# Altium integrated library Samtec 2 mm Pitch Terminal Strips.IntLib: 623 symbols (part 3 of 5)
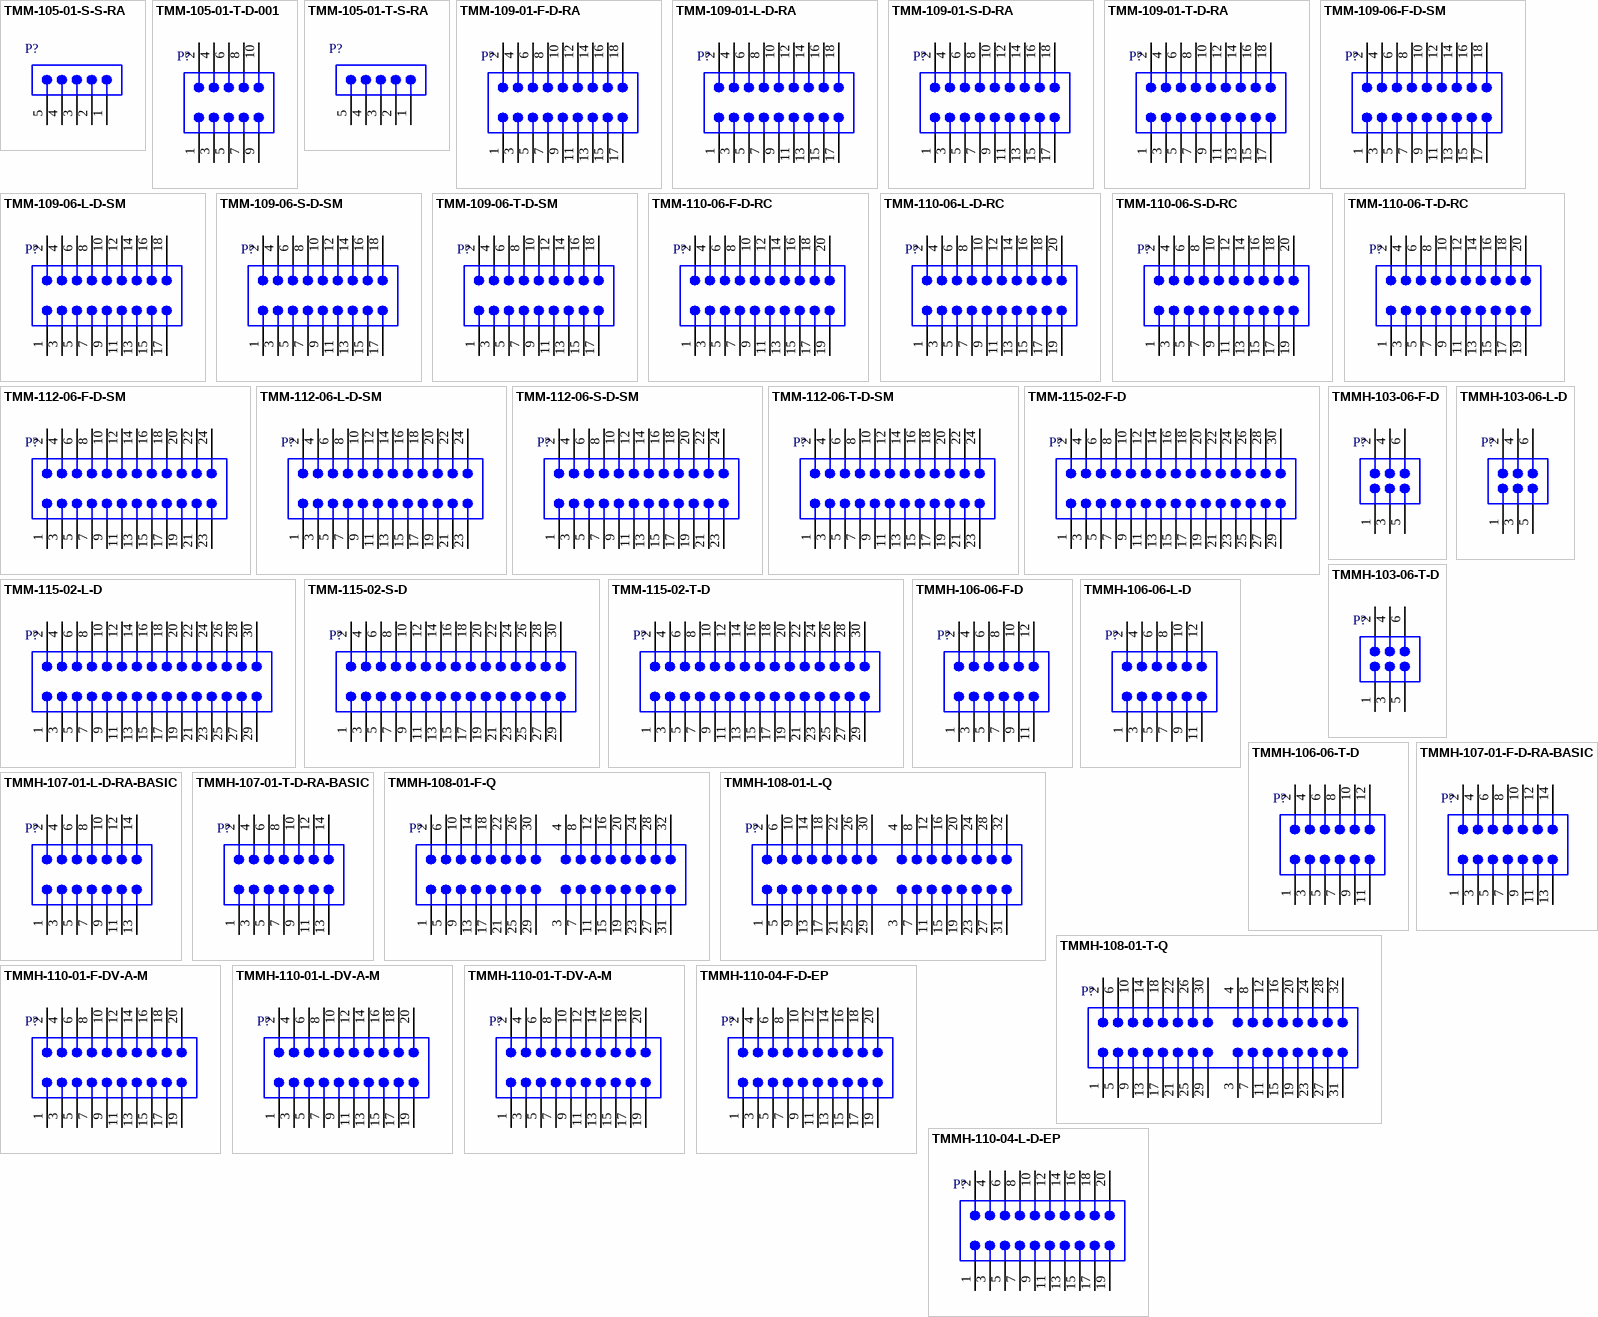
[diagram p19: symbols TMM-105-01-S-S-RA to TMMH-110-04-L-D-EP]

## TMMH-107-01-F-D-RA-BASIC
designator P?
Flexible Through-Hole Header, Right Angle, -55 to 125 degC, 2 mm Pitch, 14-Pin, Male, RoHS; Manufacturer: Samtec; PartNumber: TMMH-107-01-F-D-RA-BASIC; Pitch: 2 mm; DatasheetVersion: F-214; PackageVersion: AN, 12/1996; PackageReference: TMMH-107-01-X-D-RA-BASIC; PackageDescription: 2mm x 2mm RA Terminal Strip Assembly; Orientation: Right Angle; RoHS: True; Temperature Range: -55 to 125 degC; Mounting Technology: Through-hole; ComponentLink1Description: Manufacturer URL; ComponentLink1URL: http://www.samtec.com; ComponentLink2Description: Datasheet; ComponentLink2URL: http://d2a072wq521u33.cloudfront.net/catalog_english//TMMH_TH.PDF; ComponentLink3Description: Package Specification; ComponentLink3URL: http://www.samtec.com/documents/webfiles/cpdf/TMMH-1XX-XX-XX-X-XX-XX-XXX-MKT1.pdf
footprint SMTC-TMMH-107-01-X-D-RA-BASIC (Terminal Strip Assembly, 2x7 Pins, Right Angle, 2mm Pitch, Male)
pins: 1, 2, 3, 4, 5, 6, 7, 8, 9, 10, 11, 12, 13, 14

## TMMH-107-01-L-D-RA-BASIC
designator P?
Flexible Through-Hole Header, Right Angle, -55 to 125 degC, 2 mm Pitch, 14-Pin, Male, RoHS; Manufacturer: Samtec; PartNumber: TMMH-107-01-L-D-RA-BASIC; Pitch: 2 mm; DatasheetVersion: F-214; PackageVersion: AN, 12/1996; PackageReference: TMMH-107-01-X-D-RA-BASIC; PackageDescription: 2mm x 2mm RA Terminal Strip Assembly; Orientation: Right Angle; RoHS: True; Temperature Range: -55 to 125 degC; Mounting Technology: Through-hole; ComponentLink1Description: Manufacturer URL; ComponentLink1URL: http://www.samtec.com; ComponentLink2Description: Datasheet; ComponentLink2URL: http://d2a072wq521u33.cloudfront.net/catalog_english//TMMH_TH.PDF; ComponentLink3Description: Package Specification; ComponentLink3URL: http://www.samtec.com/documents/webfiles/cpdf/TMMH-1XX-XX-XX-X-XX-XX-XXX-MKT1.pdf
footprint SMTC-TMMH-107-01-X-D-RA-BASIC (Terminal Strip Assembly, 2x7 Pins, Right Angle, 2mm Pitch, Male)
pins: 1, 2, 3, 4, 5, 6, 7, 8, 9, 10, 11, 12, 13, 14

## TMMH-107-01-T-D-RA-BASIC
designator P?
Flexible Through-Hole Header, Right Angle, -55 to 105 degC, 2 mm Pitch, 14-Pin, Male, RoHS; Manufacturer: Samtec; PartNumber: TMMH-107-01-T-D-RA-BASIC; Pitch: 2 mm; DatasheetVersion: F-214; PackageVersion: AN, 12/1996; PackageReference: TMMH-107-01-X-D-RA-BASIC; PackageDescription: 2mm x 2mm RA Terminal Strip Assembly; Orientation: Right Angle; RoHS: True; Temperature Range: -55 to 105 degC; Mounting Technology: Through-hole; ComponentLink1Description: Manufacturer URL; ComponentLink1URL: http://www.samtec.com; ComponentLink2Description: Datasheet; ComponentLink2URL: http://d2a072wq521u33.cloudfront.net/catalog_english//TMMH_TH.PDF; ComponentLink3Description: Package Specification; ComponentLink3URL: http://www.samtec.com/documents/webfiles/cpdf/TMMH-1XX-XX-XX-X-XX-XX-XXX-MKT1.pdf
footprint SMTC-TMMH-107-01-X-D-RA-BASIC (Terminal Strip Assembly, 2x7 Pins, Right Angle, 2mm Pitch, Male)
pins: 1, 2, 3, 4, 5, 6, 7, 8, 9, 10, 11, 12, 13, 14

## TMMH-108-01-F-Q
designator P?
Flexible Through-Hole Header, Vertical, -55 to 125 degC, 2 mm Pitch, 32-Pin, Male, RoHS; Manufacturer: Samtec; PartNumber: TMMH-108-01-F-Q; Pitch: 2 mm; DatasheetVersion: F-214; PackageVersion: Q, 11/1997; PackageReference: TMMH-108-01-X-Q; PackageDescription: 2mm x 2mm Terminal Strip Assembly; Supplier 1: Newark; Supplier Part Number 1: 75P7798; Orientation: Vertical; RoHS: True; Temperature Range: -55 to 125 degC; Mounting Technology: Through-hole; ComponentLink1Description: Manufacturer URL; ComponentLink1URL: http://www.samtec.com; ComponentLink2Description: Datasheet; ComponentLink2URL: http://d2a072wq521u33.cloudfront.net/catalog_english//TMMH_TH.PDF; ComponentLink3Description: Package Specification; ComponentLink3URL: http://www.samtec.com/documents/webfiles/cpdf/TMMH-1XX-XX-XX-X-XXX-MKT.pdf
footprint SMTC-TMMH-108-01-X-Q (Terminal Strip Assembly, 4x8 Pins, Vertical, 2mm Pitch, Male)
pins: 1, 2, 3, 4, 5, 6, 7, 8, 9, 10, 11, 12, 13, 14, 15, 16, 17, 18, 19, 20, 21, 22, 23, 24, 25, 26, 27, 28, 29, 30, 31, 32

## TMMH-108-01-L-Q
designator P?
Flexible Through-Hole Header, Vertical, -55 to 125 degC, 2 mm Pitch, 32-Pin, Male, RoHS; Manufacturer: Samtec; PartNumber: TMMH-108-01-L-Q; Pitch: 2 mm; DatasheetVersion: F-214; PackageVersion: Q, 11/1997; PackageReference: TMMH-108-01-X-Q; PackageDescription: 2mm x 2mm Terminal Strip Assembly; Supplier 1: Newark; Supplier Part Number 1: 75P7838; Orientation: Vertical; RoHS: True; Temperature Range: -55 to 125 degC; Mounting Technology: Through-hole; ComponentLink1Description: Manufacturer URL; ComponentLink1URL: http://www.samtec.com; ComponentLink2Description: Datasheet; ComponentLink2URL: http://d2a072wq521u33.cloudfront.net/catalog_english//TMMH_TH.PDF; ComponentLink3Description: Package Specification; ComponentLink3URL: http://www.samtec.com/documents/webfiles/cpdf/TMMH-1XX-XX-XX-X-XXX-MKT.pdf
footprint SMTC-TMMH-108-01-X-Q (Terminal Strip Assembly, 4x8 Pins, Vertical, 2mm Pitch, Male)
pins: 1, 2, 3, 4, 5, 6, 7, 8, 9, 10, 11, 12, 13, 14, 15, 16, 17, 18, 19, 20, 21, 22, 23, 24, 25, 26, 27, 28, 29, 30, 31, 32

## TMMH-108-01-T-Q
designator P?
Flexible Through-Hole Header, Vertical, -55 to 105 degC, 2 mm Pitch, 32-Pin, Male, RoHS; Manufacturer: Samtec; PartNumber: TMMH-108-01-T-Q; Pitch: 2 mm; DatasheetVersion: F-214; PackageVersion: Q, 11/1997; PackageReference: TMMH-108-01-X-Q; PackageDescription: 2mm x 2mm Terminal Strip Assembly; Supplier 1: Newark; Supplier Part Number 1: 75P7880; Orientation: Vertical; RoHS: True; Temperature Range: -55 to 105 degC; Mounting Technology: Through-hole; ComponentLink1Description: Manufacturer URL; ComponentLink1URL: http://www.samtec.com; ComponentLink2Description: Datasheet; ComponentLink2URL: http://d2a072wq521u33.cloudfront.net/catalog_english//TMMH_TH.PDF; ComponentLink3Description: Package Specification; ComponentLink3URL: http://www.samtec.com/documents/webfiles/cpdf/TMMH-1XX-XX-XX-X-XXX-MKT.pdf
footprint SMTC-TMMH-108-01-X-Q (Terminal Strip Assembly, 4x8 Pins, Vertical, 2mm Pitch, Male)
pins: 1, 2, 3, 4, 5, 6, 7, 8, 9, 10, 11, 12, 13, 14, 15, 16, 17, 18, 19, 20, 21, 22, 23, 24, 25, 26, 27, 28, 29, 30, 31, 32

## TMMH-110-01-F-DV-A-M
designator P?
Flexible SMT Header, Vertical, -55 to 125 degC, 2 mm Pitch, 20-Pin, Male, RoHS; Manufacturer: Samtec; PartNumber: TMMH-110-01-F-DV-A-M; Pitch: 2 mm; DatasheetVersion: F-214; PackageVersion: CD, 10/1996; PackageReference: TMMH-110-01-X-DV-A-M; PackageDescription: 2mm x 2mm Terminal Strip Assembly; Orientation: Vertical; RoHS: True; Temperature Range: -55 to 125 degC; Mounting Technology: Surface Mount; ComponentLink1Description: Manufacturer URL; ComponentLink1URL: http://www.samtec.com; ComponentLink2Description: Datasheet; ComponentLink2URL: http://d2a072wq521u33.cloudfront.net/catalog_english//TMMH_SM.PDF; ComponentLink3Description: Package Specification; ComponentLink3URL: http://www.samtec.com/documents/webfiles/cpdf/TMMH-1XX-XX-XX-DV-XXX-XXX-MKT.PDF
footprint SMTC-TMMH-110-01-X-DV-A-M (Terminal Strip Assembly, 2x10 Pins, Vertical, 2mm Pitch, Male)
pins: 1, 2, 3, 4, 5, 6, 7, 8, 9, 10, 11, 12, 13, 14, 15, 16, 17, 18, 19, 20

## TMMH-110-01-L-DV-A-M
designator P?
Flexible SMT Header, Vertical, -55 to 125 degC, 2 mm Pitch, 20-Pin, Male, RoHS; Manufacturer: Samtec; PartNumber: TMMH-110-01-L-DV-A-M; Pitch: 2 mm; DatasheetVersion: F-214; PackageVersion: CD, 10/1996; PackageReference: TMMH-110-01-X-DV-A-M; PackageDescription: 2mm x 2mm Terminal Strip Assembly; Orientation: Vertical; RoHS: True; Temperature Range: -55 to 125 degC; Mounting Technology: Surface Mount; ComponentLink1Description: Manufacturer URL; ComponentLink1URL: http://www.samtec.com; ComponentLink2Description: Datasheet; ComponentLink2URL: http://d2a072wq521u33.cloudfront.net/catalog_english//TMMH_SM.PDF; ComponentLink3Description: Package Specification; ComponentLink3URL: http://www.samtec.com/documents/webfiles/cpdf/TMMH-1XX-XX-XX-DV-XXX-XXX-MKT.PDF
footprint SMTC-TMMH-110-01-X-DV-A-M (Terminal Strip Assembly, 2x10 Pins, Vertical, 2mm Pitch, Male)
pins: 1, 2, 3, 4, 5, 6, 7, 8, 9, 10, 11, 12, 13, 14, 15, 16, 17, 18, 19, 20

## TMMH-110-01-T-DV-A-M
designator P?
Flexible SMT Header, Vertical, -55 to 105 degC, 2 mm Pitch, 20-Pin, Male, RoHS; Manufacturer: Samtec; PartNumber: TMMH-110-01-T-DV-A-M; Pitch: 2 mm; DatasheetVersion: F-214; PackageVersion: CD, 10/1996; PackageReference: TMMH-110-01-X-DV-A-M; PackageDescription: 2mm x 2mm Terminal Strip Assembly; Orientation: Vertical; RoHS: True; Temperature Range: -55 to 105 degC; Mounting Technology: Surface Mount; ComponentLink1Description: Manufacturer URL; ComponentLink1URL: http://www.samtec.com; ComponentLink2Description: Datasheet; ComponentLink2URL: http://d2a072wq521u33.cloudfront.net/catalog_english//TMMH_SM.PDF; ComponentLink3Description: Package Specification; ComponentLink3URL: http://www.samtec.com/documents/webfiles/cpdf/TMMH-1XX-XX-XX-DV-XXX-XXX-MKT.PDF
footprint SMTC-TMMH-110-01-X-DV-A-M (Terminal Strip Assembly, 2x10 Pins, Vertical, 2mm Pitch, Male)
pins: 1, 2, 3, 4, 5, 6, 7, 8, 9, 10, 11, 12, 13, 14, 15, 16, 17, 18, 19, 20

## TMMH-110-04-F-D-EP
designator P?
Flexible Through-Hole Header, Vertical, -55 to 125 degC, 2 mm Pitch, 20-Pin, Male, RoHS; Manufacturer: Samtec; PartNumber: TMMH-110-04-F-D-EP; Pitch: 2 mm; DatasheetVersion: F-214; PackageVersion: AR, 12/1996; PackageReference: TMMH-110-04-X-D-EP; PackageDescription: 2mm x 2mm Terminal Strip Assembly; Orientation: Vertical; RoHS: True; Temperature Range: -55 to 125 degC; Mounting Technology: Through-hole; ComponentLink1Description: Manufacturer URL; ComponentLink1URL: http://www.samtec.com; ComponentLink2Description: Datasheet; ComponentLink2URL: http://d2a072wq521u33.cloudfront.net/catalog_english//TMMH_TH.PDF; ComponentLink3Description: Package Specification; ComponentLink3URL: http://www.samtec.com/documents/webfiles/cpdf/TMMH-1XX-XX-XX-D-XXX-XXX-MKT1.pdf
footprint SMTC-TMMH-110-04-X-D-EP (Terminal Strip Assembly, 2x10 Pins, Vertical, 2mm Pitch, Male)
pins: 1, 2, 3, 4, 5, 6, 7, 8, 9, 10, 11, 12, 13, 14, 15, 16, 17, 18, 19, 20

## TMMH-110-04-L-D-EP
designator P?
Flexible Through-Hole Header, Vertical, -55 to 125 degC, 2 mm Pitch, 20-Pin, Male, RoHS; Manufacturer: Samtec; PartNumber: TMMH-110-04-L-D-EP; Pitch: 2 mm; DatasheetVersion: F-214; PackageVersion: AR, 12/1996; PackageReference: TMMH-110-04-X-D-EP; PackageDescription: 2mm x 2mm Terminal Strip Assembly; Orientation: Vertical; RoHS: True; Temperature Range: -55 to 125 degC; Mounting Technology: Through-hole; ComponentLink1Description: Manufacturer URL; ComponentLink1URL: http://www.samtec.com; ComponentLink2Description: Datasheet; ComponentLink2URL: http://d2a072wq521u33.cloudfront.net/catalog_english//TMMH_TH.PDF; ComponentLink3Description: Package Specification; ComponentLink3URL: http://www.samtec.com/documents/webfiles/cpdf/TMMH-1XX-XX-XX-D-XXX-XXX-MKT1.pdf
footprint SMTC-TMMH-110-04-X-D-EP (Terminal Strip Assembly, 2x10 Pins, Vertical, 2mm Pitch, Male)
pins: 1, 2, 3, 4, 5, 6, 7, 8, 9, 10, 11, 12, 13, 14, 15, 16, 17, 18, 19, 20

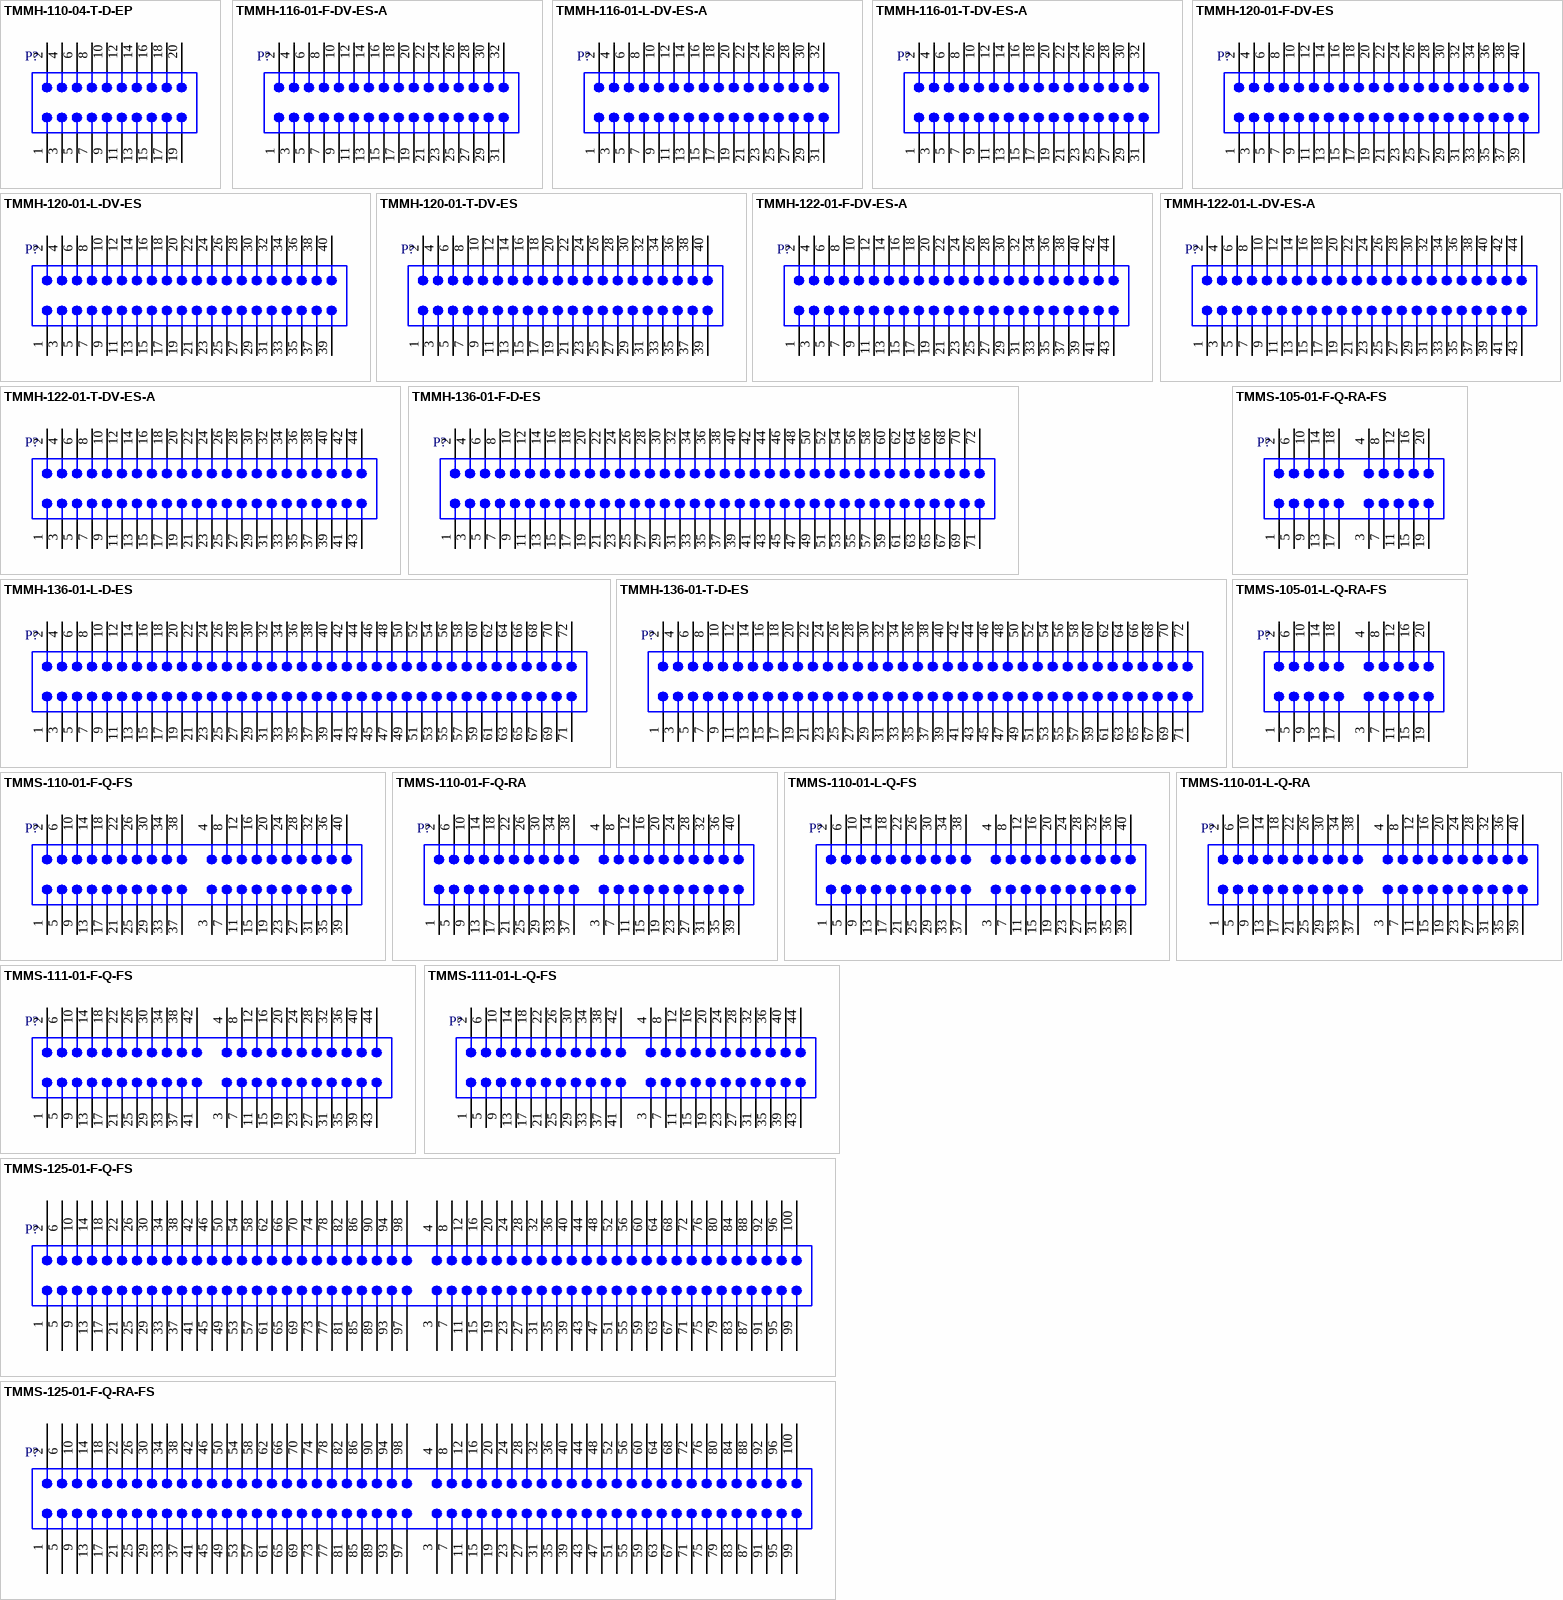
[diagram p7: symbols TMMH-110-04-T-D-EP to TMMS-125-01-F-Q-RA-FS]

## TMMH-110-04-T-D-EP
designator P?
Flexible Through-Hole Header, Vertical, -55 to 105 degC, 2 mm Pitch, 20-Pin, Male, RoHS; Manufacturer: Samtec; PartNumber: TMMH-110-04-T-D-EP; Pitch: 2 mm; DatasheetVersion: F-214; PackageVersion: AR, 12/1996; PackageReference: TMMH-110-04-X-D-EP; PackageDescription: 2mm x 2mm Terminal Strip Assembly; Orientation: Vertical; RoHS: True; Temperature Range: -55 to 105 degC; Mounting Technology: Through-hole; ComponentLink1Description: Manufacturer URL; ComponentLink1URL: http://www.samtec.com; ComponentLink2Description: Datasheet; ComponentLink2URL: http://d2a072wq521u33.cloudfront.net/catalog_english//TMMH_TH.PDF; ComponentLink3Description: Package Specification; ComponentLink3URL: http://www.samtec.com/documents/webfiles/cpdf/TMMH-1XX-XX-XX-D-XXX-XXX-MKT1.pdf
footprint SMTC-TMMH-110-04-X-D-EP (Terminal Strip Assembly, 2x10 Pins, Vertical, 2mm Pitch, Male)
pins: 1, 2, 3, 4, 5, 6, 7, 8, 9, 10, 11, 12, 13, 14, 15, 16, 17, 18, 19, 20

## TMMH-116-01-F-DV-ES-A
designator P?
Flexible SMT Header, Vertical, -55 to 125 degC, 2 mm Pitch, 32-Pin, Male, RoHS; Manufacturer: Samtec; PartNumber: TMMH-116-01-F-DV-ES-A; Pitch: 2 mm; DatasheetVersion: F-214; PackageVersion: CD, 10/1996; PackageReference: TMMH-116-01-X-DV-ES-A; PackageDescription: 2mm x 2mm Terminal Strip Assembly; Orientation: Vertical; RoHS: True; Temperature Range: -55 to 125 degC; Mounting Technology: Surface Mount; ComponentLink1Description: Manufacturer URL; ComponentLink1URL: http://www.samtec.com; ComponentLink2Description: Datasheet; ComponentLink2URL: http://d2a072wq521u33.cloudfront.net/catalog_english//TMMH_SM.PDF; ComponentLink3Description: Package Specification; ComponentLink3URL: http://www.samtec.com/documents/webfiles/cpdf/TMMH-1XX-XX-XX-DV-XXX-XXX-MKT.PDF
footprint SMTC-TMMH-116-01-X-DV-ES-A (Terminal Strip Assembly, 2x16 Pins, Vertical, 2mm Pitch, Male)
pins: 1, 2, 3, 4, 5, 6, 7, 8, 9, 10, 11, 12, 13, 14, 15, 16, 17, 18, 19, 20, 21, 22, 23, 24, 25, 26, 27, 28, 29, 30, 31, 32

## TMMH-116-01-L-DV-ES-A
designator P?
Flexible SMT Header, Vertical, -55 to 125 degC, 2 mm Pitch, 32-Pin, Male, RoHS; Manufacturer: Samtec; PartNumber: TMMH-116-01-L-DV-ES-A; Pitch: 2 mm; DatasheetVersion: F-214; PackageVersion: CD, 10/1996; PackageReference: TMMH-116-01-X-DV-ES-A; PackageDescription: 2mm x 2mm Terminal Strip Assembly; Supplier 1: Newark; Supplier Part Number 1: 76P0479; Orientation: Vertical; RoHS: True; Temperature Range: -55 to 125 degC; Mounting Technology: Surface Mount; ComponentLink1Description: Manufacturer URL; ComponentLink1URL: http://www.samtec.com; ComponentLink2Description: Datasheet; ComponentLink2URL: http://d2a072wq521u33.cloudfront.net/catalog_english//TMMH_SM.PDF; ComponentLink3Description: Package Specification; ComponentLink3URL: http://www.samtec.com/documents/webfiles/cpdf/TMMH-1XX-XX-XX-DV-XXX-XXX-MKT.PDF
footprint SMTC-TMMH-116-01-X-DV-ES-A (Terminal Strip Assembly, 2x16 Pins, Vertical, 2mm Pitch, Male)
pins: 1, 2, 3, 4, 5, 6, 7, 8, 9, 10, 11, 12, 13, 14, 15, 16, 17, 18, 19, 20, 21, 22, 23, 24, 25, 26, 27, 28, 29, 30, 31, 32

## TMMH-116-01-T-DV-ES-A
designator P?
Flexible SMT Header, Vertical, -55 to 105 degC, 2 mm Pitch, 32-Pin, Male, RoHS; Manufacturer: Samtec; PartNumber: TMMH-116-01-T-DV-ES-A; Pitch: 2 mm; DatasheetVersion: F-214; PackageVersion: CD, 10/1996; PackageReference: TMMH-116-01-X-DV-ES-A; PackageDescription: 2mm x 2mm Terminal Strip Assembly; Orientation: Vertical; RoHS: True; Temperature Range: -55 to 105 degC; Mounting Technology: Surface Mount; ComponentLink1Description: Manufacturer URL; ComponentLink1URL: http://www.samtec.com; ComponentLink2Description: Datasheet; ComponentLink2URL: http://d2a072wq521u33.cloudfront.net/catalog_english//TMMH_SM.PDF; ComponentLink3Description: Package Specification; ComponentLink3URL: http://www.samtec.com/documents/webfiles/cpdf/TMMH-1XX-XX-XX-DV-XXX-XXX-MKT.PDF
footprint SMTC-TMMH-116-01-X-DV-ES-A (Terminal Strip Assembly, 2x16 Pins, Vertical, 2mm Pitch, Male)
pins: 1, 2, 3, 4, 5, 6, 7, 8, 9, 10, 11, 12, 13, 14, 15, 16, 17, 18, 19, 20, 21, 22, 23, 24, 25, 26, 27, 28, 29, 30, 31, 32

## TMMH-120-01-F-DV-ES
designator P?
Flexible SMT Header, Vertical, -55 to 125 degC, 2 mm Pitch, 40-Pin, Male, RoHS; Manufacturer: Samtec; PartNumber: TMMH-120-01-F-DV-ES; Pitch: 2 mm; DatasheetVersion: F-214; PackageVersion: CD, 10/1996; PackageReference: TMMH-120-01-X-DV-ES; PackageDescription: 2mm x 2mm Terminal Strip Assembly; Orientation: Vertical; RoHS: True; Temperature Range: -55 to 125 degC; Mounting Technology: Surface Mount; ComponentLink1Description: Manufacturer URL; ComponentLink1URL: http://www.samtec.com; ComponentLink2Description: Datasheet; ComponentLink2URL: http://d2a072wq521u33.cloudfront.net/catalog_english//TMMH_SM.PDF; ComponentLink3Description: Package Specification; ComponentLink3URL: http://www.samtec.com/documents/webfiles/cpdf/TMMH-1XX-XX-XX-DV-XXX-XXX-MKT.PDF
footprint SMTC-TMMH-120-01-X-DV-ES (Terminal Strip Assembly, 2x20 Pins, Vertical, 2mm Pitch, Male)
pins: 1, 2, 3, 4, 5, 6, 7, 8, 9, 10, 11, 12, 13, 14, 15, 16, 17, 18, 19, 20, 21, 22, 23, 24, 25, 26, 27, 28, 29, 30, 31, 32, 33, 34, 35, 36, 37, 38, 39, 40

## TMMH-120-01-L-DV-ES
designator P?
Flexible SMT Header, Vertical, -55 to 125 degC, 2 mm Pitch, 40-Pin, Male, RoHS; Manufacturer: Samtec; PartNumber: TMMH-120-01-L-DV-ES; Pitch: 2 mm; DatasheetVersion: F-214; PackageVersion: CD, 10/1996; PackageReference: TMMH-120-01-X-DV-ES; PackageDescription: 2mm x 2mm Terminal Strip Assembly; Orientation: Vertical; RoHS: True; Temperature Range: -55 to 125 degC; Mounting Technology: Surface Mount; ComponentLink1Description: Manufacturer URL; ComponentLink1URL: http://www.samtec.com; ComponentLink2Description: Datasheet; ComponentLink2URL: http://d2a072wq521u33.cloudfront.net/catalog_english//TMMH_SM.PDF; ComponentLink3Description: Package Specification; ComponentLink3URL: http://www.samtec.com/documents/webfiles/cpdf/TMMH-1XX-XX-XX-DV-XXX-XXX-MKT.PDF
footprint SMTC-TMMH-120-01-X-DV-ES (Terminal Strip Assembly, 2x20 Pins, Vertical, 2mm Pitch, Male)
pins: 1, 2, 3, 4, 5, 6, 7, 8, 9, 10, 11, 12, 13, 14, 15, 16, 17, 18, 19, 20, 21, 22, 23, 24, 25, 26, 27, 28, 29, 30, 31, 32, 33, 34, 35, 36, 37, 38, 39, 40

## TMMH-120-01-T-DV-ES
designator P?
Flexible SMT Header, Vertical, -55 to 105 degC, 2 mm Pitch, 40-Pin, Male, RoHS; Manufacturer: Samtec; PartNumber: TMMH-120-01-T-DV-ES; Pitch: 2 mm; DatasheetVersion: F-214; PackageVersion: CD, 10/1996; PackageReference: TMMH-120-01-X-DV-ES; PackageDescription: 2mm x 2mm Terminal Strip Assembly; Orientation: Vertical; RoHS: True; Temperature Range: -55 to 105 degC; Mounting Technology: Surface Mount; ComponentLink1Description: Manufacturer URL; ComponentLink1URL: http://www.samtec.com; ComponentLink2Description: Datasheet; ComponentLink2URL: http://d2a072wq521u33.cloudfront.net/catalog_english//TMMH_SM.PDF; ComponentLink3Description: Package Specification; ComponentLink3URL: http://www.samtec.com/documents/webfiles/cpdf/TMMH-1XX-XX-XX-DV-XXX-XXX-MKT.PDF
footprint SMTC-TMMH-120-01-X-DV-ES (Terminal Strip Assembly, 2x20 Pins, Vertical, 2mm Pitch, Male)
pins: 1, 2, 3, 4, 5, 6, 7, 8, 9, 10, 11, 12, 13, 14, 15, 16, 17, 18, 19, 20, 21, 22, 23, 24, 25, 26, 27, 28, 29, 30, 31, 32, 33, 34, 35, 36, 37, 38, 39, 40

## TMMH-122-01-F-DV-ES-A
designator P?
Flexible SMT Header, Vertical, -55 to 125 degC, 2 mm Pitch, 44-Pin, Male, RoHS; Manufacturer: Samtec; PartNumber: TMMH-122-01-F-DV-ES-A; Pitch: 2 mm; DatasheetVersion: F-214; PackageVersion: CD, 10/1996; PackageReference: TMMH-122-01-X-DV-ES-A; PackageDescription: 2mm x 2mm Terminal Strip Assembly; Orientation: Vertical; RoHS: True; Temperature Range: -55 to 125 degC; Mounting Technology: Surface Mount; ComponentLink1Description: Manufacturer URL; ComponentLink1URL: http://www.samtec.com; ComponentLink2Description: Datasheet; ComponentLink2URL: http://d2a072wq521u33.cloudfront.net/catalog_english//TMMH_SM.PDF; ComponentLink3Description: Package Specification; ComponentLink3URL: http://www.samtec.com/documents/webfiles/cpdf/TMMH-1XX-XX-XX-DV-XXX-XXX-MKT.PDF
footprint SMTC-TMMH-122-01-X-DV-ES-A (Terminal Strip Assembly, 2x22 Pins, Vertical, 2mm Pitch, Male)
pins: 1, 2, 3, 4, 5, 6, 7, 8, 9, 10, 11, 12, 13, 14, 15, 16, 17, 18, 19, 20, 21, 22, 23, 24, 25, 26, 27, 28, 29, 30, 31, 32, 33, 34, 35, 36, 37, 38, 39, 40, 41, 42, 43, 44

## TMMH-122-01-L-DV-ES-A
designator P?
Flexible SMT Header, Vertical, -55 to 125 degC, 2 mm Pitch, 44-Pin, Male, RoHS; Manufacturer: Samtec; PartNumber: TMMH-122-01-L-DV-ES-A; Pitch: 2 mm; DatasheetVersion: F-214; PackageVersion: CD, 10/1996; PackageReference: TMMH-122-01-X-DV-ES-A; PackageDescription: 2mm x 2mm Terminal Strip Assembly; Orientation: Vertical; RoHS: True; Temperature Range: -55 to 125 degC; Mounting Technology: Surface Mount; ComponentLink1Description: Manufacturer URL; ComponentLink1URL: http://www.samtec.com; ComponentLink2Description: Datasheet; ComponentLink2URL: http://d2a072wq521u33.cloudfront.net/catalog_english//TMMH_SM.PDF; ComponentLink3Description: Package Specification; ComponentLink3URL: http://www.samtec.com/documents/webfiles/cpdf/TMMH-1XX-XX-XX-DV-XXX-XXX-MKT.PDF
footprint SMTC-TMMH-122-01-X-DV-ES-A (Terminal Strip Assembly, 2x22 Pins, Vertical, 2mm Pitch, Male)
pins: 1, 2, 3, 4, 5, 6, 7, 8, 9, 10, 11, 12, 13, 14, 15, 16, 17, 18, 19, 20, 21, 22, 23, 24, 25, 26, 27, 28, 29, 30, 31, 32, 33, 34, 35, 36, 37, 38, 39, 40, 41, 42, 43, 44

## TMMH-122-01-T-DV-ES-A
designator P?
Flexible SMT Header, Vertical, -55 to 105 degC, 2 mm Pitch, 44-Pin, Male, RoHS; Manufacturer: Samtec; PartNumber: TMMH-122-01-T-DV-ES-A; Pitch: 2 mm; DatasheetVersion: F-214; PackageVersion: CD, 10/1996; PackageReference: TMMH-122-01-X-DV-ES-A; PackageDescription: 2mm x 2mm Terminal Strip Assembly; Orientation: Vertical; RoHS: True; Temperature Range: -55 to 105 degC; Mounting Technology: Surface Mount; ComponentLink1Description: Manufacturer URL; ComponentLink1URL: http://www.samtec.com; ComponentLink2Description: Datasheet; ComponentLink2URL: http://d2a072wq521u33.cloudfront.net/catalog_english//TMMH_SM.PDF; ComponentLink3Description: Package Specification; ComponentLink3URL: http://www.samtec.com/documents/webfiles/cpdf/TMMH-1XX-XX-XX-DV-XXX-XXX-MKT.PDF
footprint SMTC-TMMH-122-01-X-DV-ES-A (Terminal Strip Assembly, 2x22 Pins, Vertical, 2mm Pitch, Male)
pins: 1, 2, 3, 4, 5, 6, 7, 8, 9, 10, 11, 12, 13, 14, 15, 16, 17, 18, 19, 20, 21, 22, 23, 24, 25, 26, 27, 28, 29, 30, 31, 32, 33, 34, 35, 36, 37, 38, 39, 40, 41, 42, 43, 44

## TMMH-136-01-F-D-ES
designator P?
Flexible Through-Hole Header, Vertical, -55 to 125 degC, 2 mm Pitch, 72-Pin, Male, RoHS; Manufacturer: Samtec; PartNumber: TMMH-136-01-F-D-ES; Pitch: 2 mm; DatasheetVersion: F-214; PackageVersion: AR, 12/1996; PackageReference: TMMH-136-01-X-D-ES; PackageDescription: 2mm x 2mm Terminal Strip Assembly; Orientation: Vertical; RoHS: True; Temperature Range: -55 to 125 degC; Mounting Technology: Through-hole; ComponentLink1Description: Manufacturer URL; ComponentLink1URL: http://www.samtec.com; ComponentLink2Description: Datasheet; ComponentLink2URL: http://d2a072wq521u33.cloudfront.net/catalog_english//TMMH_TH.PDF; ComponentLink3Description: Package Specification; ComponentLink3URL: http://www.samtec.com/documents/webfiles/cpdf/TMMH-1XX-XX-XX-D-XXX-XXX-MKT1.pdf
footprint SMTC-TMMH-136-01-X-D-ES (Terminal Strip Assembly, 2x36 Pins, Vertical, 2mm Pitch, Male)
pins: 1, 2, 3, 4, 5, 6, 7, 8, 9, 10, 11, 12, 13, 14, 15, 16, 17, 18, 19, 20, 21, 22, 23, 24, 25, 26, 27, 28, 29, 30, 31, 32, 33, 34, 35, 36, 37, 38, 39, 40, 41, 42, 43, 44, 45, 46, 47, 48, 49, 50, 51, 52, 53, 54, 55, 56, 57, 58, 59, 60, 61, 62, 63, 64, 65, 66, 67, 68, 69, 70, 71, 72
